# Altium footprint library 13-IC Packages-3pic1.PcbLib: 49 footprints (part 4 of 4)
Each footprint in its own frame and in the unit in brackets; x right, y up, seen from the top. Pads: shape width x height; smd on the part's side, far side on the other; paste and mask are expansions set on the pad; w line width, h text height; cw(c..) or ccw(c..) is an arc to the next point about the centre after c.
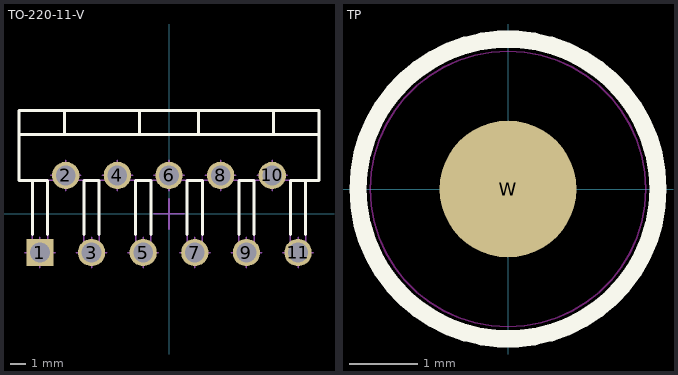
[diagram p3: the footprints below, top view; thin cyan lines are the x and y axes]

## TO-220-11-V [mm] "TO-220 11 Leads - Vertical Mount"
height 20.82
pads (11):
  rect 1.8x1.8 hole 1.3: 1(-8.5,-2.54)
  round 1.8 hole 1.3: 2(-6.8,2.54) 3(-5.1,-2.54) 4(-3.4,2.54) 5(-1.7,-2.54) 6(0,2.54) 7(1.7,-2.54) 8(3.4,2.54) 9(5.1,-2.54) 10(6.8,2.54) 11(8.5,-2.54)
Top Overlay:
  lines w0.2: -9.88,5.23 9.88,5.23 ; -9,-1.34 -9,2.21 ; -8,-1.34 -8,2.21 -9.88,2.21 -9.88,6.83 9.88,6.83 9.88,2.21 8,2.21 8,-1.34 ; -6.88,5.23 -6.88,6.83 ; -5.6,-1.34 -5.6,2.21 -4.6,2.21 -4.6,-1.34 ; -2.2,-1.34 -2.2,2.21 -1.2,2.21 -1.2,-1.34 ; -1.93,5.23 -1.93,6.83 ; 1.2,-1.34 1.2,2.21 2.2,2.21 2.2,-1.34 ; 1.93,5.23 1.93,6.83 ; 4.6,-1.34 4.6,2.21 5.6,2.21 5.6,-1.34 ; 6.88,5.23 6.88,6.83 ; 9,-1.34 9,2.21
Mechanical 8:
  lines w0.1: -9.5,-2.54 -8.5,-2.54 ; -8.5,-3.54 -8.5,-2.54 ; -8.5,-1.54 -8.5,-2.54 ; -7.8,2.54 -6.8,2.54 ; -7.5,-2.54 -8.5,-2.54 ; -6.8,1.54 -6.8,2.54 ; -6.8,3.54 -6.8,2.54 ; -6.1,-2.54 -5.1,-2.54 ; -5.8,2.54 -6.8,2.54 ; -5.1,-3.54 -5.1,-2.54 ; -5.1,-1.54 -5.1,-2.54 ; -4.4,2.54 -3.4,2.54 ; -4.1,-2.54 -5.1,-2.54 ; -3.4,1.54 -3.4,2.54 ; -3.4,3.54 -3.4,2.54 ; -2.7,-2.54 -1.7,-2.54 ; -2.4,2.54 -3.4,2.54 ; -1.7,-3.54 -1.7,-2.54 ; -1.7,-1.54 -1.7,-2.54 ; -1,0 0,0 ; -1,2.54 0,2.54 ; -0.7,-2.54 -1.7,-2.54 ; 0,-1 0,0 ; 0,1 0,0 ; 0,1.54 0,2.54 ; 0,3.54 0,2.54 ; 0.7,-2.54 1.7,-2.54 ; 1,0 0,0 ; 1,2.54 0,2.54 ; 1.7,-3.54 1.7,-2.54 ; 1.7,-1.54 1.7,-2.54 ; 2.4,2.54 3.4,2.54 ; 2.7,-2.54 1.7,-2.54 ; 3.4,1.54 3.4,2.54 ; 3.4,3.54 3.4,2.54 ; 4.1,-2.54 5.1,-2.54 ; 4.4,2.54 3.4,2.54 ; 5.1,-3.54 5.1,-2.54 ; 5.1,-1.54 5.1,-2.54 ; 5.8,2.54 6.8,2.54 ; 6.1,-2.54 5.1,-2.54 ; 6.8,1.54 6.8,2.54 ; 6.8,3.54 6.8,2.54 ; 7.5,-2.54 8.5,-2.54 ; 7.8,2.54 6.8,2.54 ; 8.5,-3.54 8.5,-2.54 ; 8.5,-1.54 8.5,-2.54 ; 9.5,-2.54 8.5,-2.54
Mechanical 14:
  lines w0.1: -9.88,5.23 9.88,5.23 ; -9,2.21 -9,-2.84 -8,-2.84 -8,2.21 ; -6.88,5.23 -6.88,6.83 ; -5.6,2.21 -5.6,-2.84 -4.6,-2.84 -4.6,2.21 ; -2.2,2.21 -2.2,-2.84 -1.2,-2.84 -1.2,2.21 ; -1.93,5.23 -1.93,6.83 ; 1.2,2.21 1.2,-2.84 2.2,-2.84 2.2,2.21 ; 1.93,5.23 1.93,6.83 ; 4.6,2.21 4.6,-2.84 5.6,-2.84 5.6,2.21 ; 6.88,5.23 6.88,6.83 ; 8,2.21 8,-2.84 9,-2.84 9,2.21 ; -9.88,2.21 -9.88,6.83 9.88,6.83 9.88,2.21 -9.88,2.21
3D body "TO-220-11-V.stp": height 21.09, standoff -3.8, extent -9.88,-2.84 9.88,6.83

## TP [mm]
height 11.7
pads (1):
  round 2 smd mask+1: W(0,0)
Top Overlay:
  circle w0.254: c0,0 r2.195
Keep-Out Layer:
  circle w0.025: c0,0 r2.017
3D body "1_016-1_016-3_tp.stp": height 0.02, standoff 0, extent -1.5,-1.5 1.5,1.5